# Altium footprint library 试用版PCB3D封装库.PcbLib: 91 footprints (part 3 of 6)
Each footprint in its own frame and in the unit in brackets; x right, y up, seen from the top. Pads: shape width x height; smd on the part's side, far side on the other; paste and mask are expansions set on the pad; w line width, h text height; cw(c..) or ccw(c..) is an arc to the next point about the centre after c.
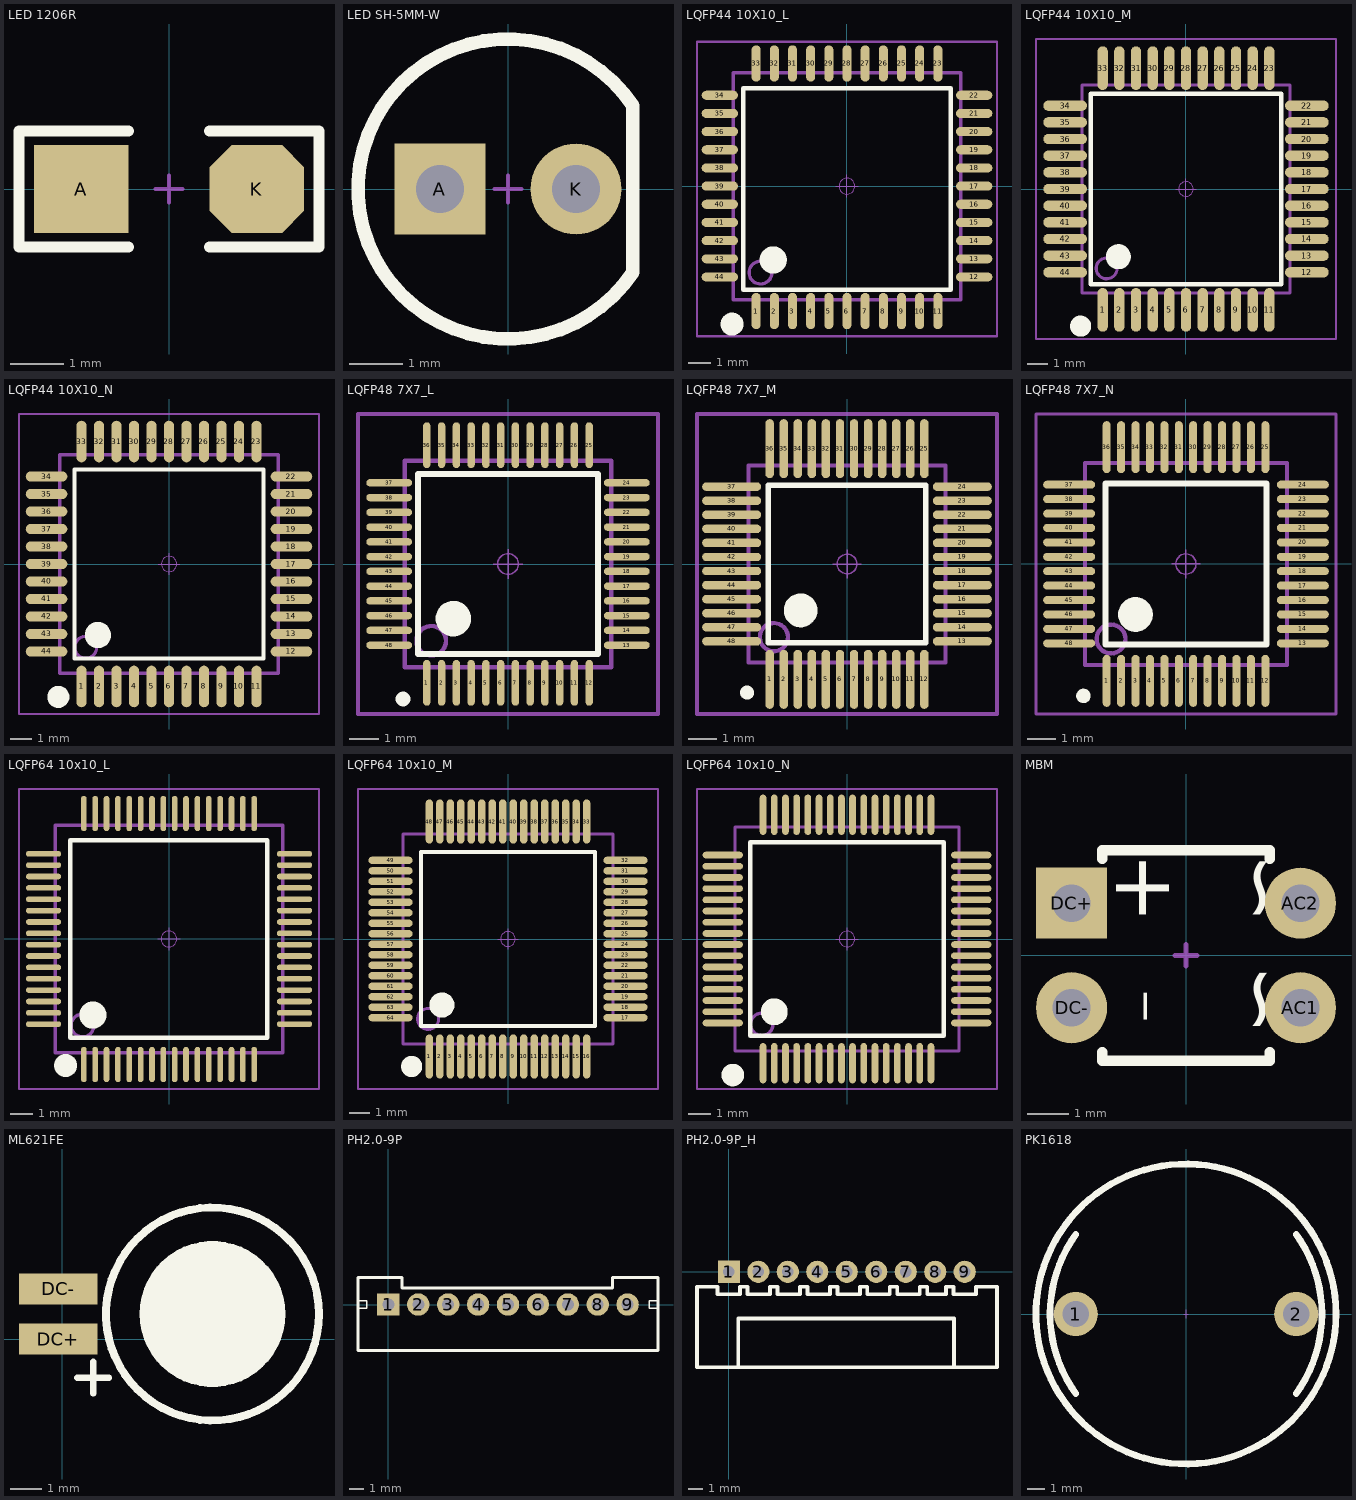
[diagram p2: the footprints below, top view; thin cyan lines are the x and y axes]

## LED 1206R [mil] "红色1206LED"
pads (2):
  rect 70x65 smd: A(-65,0)
  oct 70x65 smd: K(65,0)
Top Overlay:
  lines w8: -30,-43 -111,-43 -111,43 -109,43 -30,43 ; 30,-43 109,-43 ; 30,43 111,43 111,-43
Mechanical 15:
  lines w3: -10,0 10,0 ; 0,-10 0,10
3D body: height 35.58, standoff -0.16, extent -63.03,-31.54 63.03,31.54
3D body: height 39.57, standoff 19.88, extent -44.33,-31.54 44.33,31.54

## LED SH-5MM-W [mm] "白色5mm草帽，直插LED"
height 10.16
pads (2):
  rect 1.7x1.7 hole 0.9: A(-1.27,0)
  round 1.7 hole 0.9: K(1.27,0)
Top Overlay:
  lines w0.254: 2.33,-1.553 cw(c0,0) 2.33,1.553 2.33,-1.553
Mechanical 15:
  lines w0.076: -0.254,0 0.254,0 ; 0,-0.254 0,0.254
3D body: height 3.42, standoff -3.45, extent -1.584,-0.745 1.535,0.755
3D body: height 4.85, standoff 0.05, extent -2.75,-2.75 2.41,2.75

## LQFP44 10X10_L [mm] "10*10*1.4(长宽高，除引脚）"
pads (44):
  oval 0.4x1.6 smd: 1(-4,-5.5) 2(-3.2,-5.5) 3(-2.4,-5.5) 4(-1.6,-5.5) 5(-0.8,-5.5) 6(0,-5.5) 7(0.8,-5.5) 8(1.6,-5.5) 9(2.4,-5.5) 10(3.2,-5.5) 11(4,-5.5) 23(4,5.4) 24(3.2,5.4) 25(2.4,5.4) 26(1.6,5.4) 27(0.8,5.4) 28(0,5.4) 29(-0.8,5.4) 30(-1.6,5.4) 31(-2.4,5.4) 32(-3.2,5.4) 33(-4,5.4)
  oval 1.6x0.4 smd: 12(5.6,-4) 13(5.6,-3.2) 14(5.6,-2.4) 15(5.6,-1.6) 16(5.6,-0.8) 17(5.6,0) 18(5.6,0.8) 19(5.6,1.6) 20(5.6,2.4) 21(5.6,3.2) 22(5.6,4) 34(-5.6,4) 35(-5.6,3.2) 36(-5.6,2.4) 37(-5.6,1.6) 38(-5.6,0.8) 39(-5.6,0) 40(-5.6,-0.8) 41(-5.6,-1.6) 42(-5.6,-2.4) 43(-5.6,-3.2) 44(-5.6,-4)
Top Overlay:
  circle w0.6: c-3.25,-3.25 r0.3
  circle w0.508: c-5.06,-6.076 r0.25
  lines w0.2: -4.572,-4.572 -4.572,4.318 4.572,4.318 4.572,-4.572 -4.572,-4.572
Mechanical 13:
  circle w0.15: c-3.81,-3.81 r0.5
  lines w0.15: -5,-5 5,-5 5,5 -5,5 -5,-5
Mechanical 15:
  circle w0.05: c0,0 r0.35
  lines w0.05: -0.5,0 0.5,0 ; 0,-0.5 0,0.5
  lines w0.1: -6.604,-6.604 -6.604,6.35 6.604,6.35 6.604,-6.604 -6.604,-6.604
3D body: height 1.45, standoff 0, extent -6,-6 6,6

## LQFP44 10X10_M [mm] "10*10*1.4(长宽高，除引脚）"
pads (44):
  oval 0.5x2.1 smd: 1(-4,-5.8) 2(-3.2,-5.8) 3(-2.4,-5.8) 4(-1.6,-5.8) 5(-0.8,-5.8) 6(0,-5.8) 7(0.8,-5.8) 8(1.6,-5.8) 9(2.4,-5.8) 10(3.2,-5.8) 11(4,-5.8) 23(4,5.8) 24(3.2,5.8) 25(2.4,5.8) 26(1.6,5.8) 27(0.8,5.8) 28(0,5.8) 29(-0.8,5.8) 30(-1.6,5.8) 31(-2.4,5.8) 32(-3.2,5.8) 33(-4,5.8)
  oval 2.1x0.5 smd: 12(5.8,-4) 13(5.8,-3.2) 14(5.8,-2.4) 15(5.8,-1.6) 16(5.8,-0.8) 17(5.8,0) 18(5.8,0.8) 19(5.8,1.6) 20(5.8,2.4) 21(5.8,3.2) 22(5.8,4) 34(-5.8,4) 35(-5.8,3.2) 36(-5.8,2.4) 37(-5.8,1.6) 38(-5.8,0.8) 39(-5.8,0) 40(-5.8,-0.8) 41(-5.8,-1.6) 42(-5.8,-2.4) 43(-5.8,-3.2) 44(-5.8,-4)
Top Overlay:
  circle w0.6: c-3.25,-3.25 r0.3
  circle w0.508: c-5.06,-6.584 r0.25
  lines w0.2: -4.572,-4.572 -4.572,4.572 4.572,4.572 4.572,-4.572 -4.572,-4.572
Mechanical 13:
  circle w0.15: c-3.81,-3.81 r0.5
  lines w0.15: -5,-5 -5,5 5,5 5,-5 -5,-5
Mechanical 15:
  circle w0.05: c0,0 r0.35
  lines w0.05: -0.5,0 0.5,0 ; 0,-0.5 0,0.5
  lines w0.1: -7.2,-7.2 -7.2,7.2 7.2,7.2 7.2,-7.2 -7.2,-7.2
3D body: height 1.45, standoff 0, extent -6,-6 6,6

## LQFP44 10X10_N [mm] "10*10*1.4(长宽高，除引脚）"
pads (44):
  oval 0.45x1.9 smd: 1(-4,-5.6) 2(-3.2,-5.6) 3(-2.4,-5.6) 4(-1.6,-5.6) 5(-0.8,-5.6) 6(0,-5.6) 7(0.8,-5.6) 8(1.6,-5.6) 9(2.4,-5.6) 10(3.2,-5.6) 11(4,-5.6) 23(4,5.6) 24(3.2,5.6) 25(2.4,5.6) 26(1.6,5.6) 27(0.8,5.6) 28(0,5.6) 29(-0.8,5.6) 30(-1.6,5.6) 31(-2.4,5.6) 32(-3.2,5.6) 33(-4,5.6)
  oval 1.9x0.45 smd: 12(5.6,-4) 13(5.6,-3.2) 14(5.6,-2.4) 15(5.6,-1.6) 16(5.6,-0.8) 17(5.6,0) 18(5.6,0.8) 19(5.6,1.6) 20(5.6,2.4) 21(5.6,3.2) 22(5.6,4) 34(-5.6,4) 35(-5.6,3.2) 36(-5.6,2.4) 37(-5.6,1.6) 38(-5.6,0.8) 39(-5.6,0) 40(-5.6,-0.8) 41(-5.6,-1.6) 42(-5.6,-2.4) 43(-5.6,-3.2) 44(-5.6,-4)
Top Overlay:
  circle w0.508: c-5.06,-6.076 r0.25
  circle w0.6: c-3.25,-3.25 r0.3
  lines w0.2: -4.318,-4.318 -4.318,4.318 4.318,4.318 4.318,-4.318 -4.318,-4.318
Mechanical 13:
  circle w0.15: c-3.81,-3.81 r0.5
  lines w0.15: -5,-5 -5,5 5,5 5,-5 -5,-5
Mechanical 15:
  circle w0.05: c0,0 r0.35
  lines w0.05: -0.5,0 0.5,0 ; 0,-0.5 0,0.5
  lines w0.1: -6.858,-6.858 -6.858,6.858 6.858,6.858 6.858,-6.858 -6.858,-6.858
3D body: height 1.45, standoff 0, extent -6,-6 6,6

## LQFP48 7X7_L [mm] "7*7*1.4(长宽高，除引脚）"
height 1.6
pads (48):
  oval 0.25x1.55 smd: 1(-2.75,-4.025) 2(-2.25,-4.025) 3(-1.75,-4.025) 4(-1.25,-4.025) 5(-0.75,-4.025) 6(-0.25,-4.025) 7(0.25,-4.025) 8(0.75,-4.025) 9(1.25,-4.025) 10(1.75,-4.025) 11(2.25,-4.025) 12(2.75,-4.025) 25(2.75,4.025) 26(2.25,4.025) 27(1.75,4.025) 28(1.25,4.025) 29(0.75,4.025) 30(0.25,4.025) 31(-0.25,4.025) 32(-0.75,4.025) 33(-1.25,4.025) 34(-1.75,4.025) 35(-2.25,4.025) 36(-2.75,4.025)
  oval 1.55x0.25 smd: 13(4.025,-2.75) 14(4.025,-2.25) 15(4.025,-1.75) 16(4.025,-1.25) 17(4.025,-0.75) 18(4.025,-0.25) 19(4.025,0.25) 20(4.025,0.75) 21(4.025,1.25) 22(4.025,1.75) 23(4.025,2.25) 24(4.025,2.75) 37(-4.025,2.75) 38(-4.025,2.25) 39(-4.025,1.75) 40(-4.025,1.25) 41(-4.025,0.75) 42(-4.025,0.25) 43(-4.025,-0.25) 44(-4.025,-0.75) 45(-4.025,-1.25) 46(-4.025,-1.75) 47(-4.025,-2.25) 48(-4.025,-2.75)
Top Overlay:
  circle w0.25: c-3.556,-4.572 r0.125
  circle w0.6: c-1.85,-1.85 r0.3
  lines w0.2: -3.048,-3.048 3.048,-3.048 3.048,3.048 -3.048,3.048 -3.048,-3.048
Mechanical 13:
  circle w0.15: c-2.6,-2.6 r0.5
  lines w0.15: -3.5,-3.5 3.5,-3.5 3.5,3.5 -3.5,3.5 -3.5,-3.5
Mechanical 15:
  circle w0.05: c0,0 r0.35
  lines w0.05: -0.5,0 0.5,0 ; 0,-0.5 0,0.5
  lines w0.15: -5.08,-5.08 5.08,-5.08 5.08,5.08 -5.08,5.08 -5.08,-5.08
3D body: height 1.45, standoff 0, extent -4.5,-4.5 4.5,4.5

## LQFP48 7X7_M [mm] "7*7*1.4(长宽高，除引脚）"
height 1.6
pads (48):
  oval 0.3x2.1 smd: 1(-2.75,-4.1) 2(-2.25,-4.1) 3(-1.75,-4.1) 4(-1.25,-4.1) 5(-0.75,-4.1) 6(-0.25,-4.1) 7(0.25,-4.1) 8(0.75,-4.1) 9(1.25,-4.1) 10(1.75,-4.1) 11(2.25,-4.1) 12(2.75,-4.1) 25(2.75,4.1) 26(2.25,4.1) 27(1.75,4.1) 28(1.25,4.1) 29(0.75,4.1) 30(0.25,4.1) 31(-0.25,4.1) 32(-0.75,4.1) 33(-1.25,4.1) 34(-1.75,4.1) 35(-2.25,4.1) 36(-2.75,4.1)
  oval 2.1x0.3 smd: 13(4.1,-2.75) 14(4.1,-2.25) 15(4.1,-1.75) 16(4.1,-1.25) 17(4.1,-0.75) 18(4.1,-0.25) 19(4.1,0.25) 20(4.1,0.75) 21(4.1,1.25) 22(4.1,1.75) 23(4.1,2.25) 24(4.1,2.75) 37(-4.1,2.75) 38(-4.1,2.25) 39(-4.1,1.75) 40(-4.1,1.25) 41(-4.1,0.75) 42(-4.1,0.25) 43(-4.1,-0.25) 44(-4.1,-0.75) 45(-4.1,-1.25) 46(-4.1,-1.75) 47(-4.1,-2.25) 48(-4.1,-2.75)
Top Overlay:
  circle w0.6: c-1.65,-1.65 r0.3
  circle w0.25: c-3.556,-4.572 r0.125
  lines w0.2: -2.794,-2.794 -2.794,2.794 2.794,2.794 2.794,-2.794 -2.794,-2.794
Mechanical 13:
  circle w0.15: c-2.6,-2.6 r0.5
  lines w0.15: -3.5,-3.5 -3.5,3.5 3.5,3.5 3.5,-3.5 -3.5,-3.5
Mechanical 15:
  circle w0.05: c0,0 r0.35
  lines w0.05: -0.5,0 0.5,0 ; 0,-0.5 0,0.5
  lines w0.15: -5.334,-5.334 -5.334,5.334 5.334,5.334 5.334,-5.334 -5.334,-5.334
3D body: height 1.45, standoff 0, extent -4.5,-4.5 4.5,4.5

## LQFP48 7X7_N [mm] "7*7*1.4(长宽高，除引脚）"
height 1.6
pads (48):
  oval 0.279x1.8 smd: 1(-2.75,-4.05) 2(-2.25,-4.05) 3(-1.75,-4.05) 4(-1.25,-4.05) 5(-0.75,-4.05) 6(-0.25,-4.05) 7(0.25,-4.05) 8(0.75,-4.05) 9(1.25,-4.05) 10(1.75,-4.05) 11(2.25,-4.05) 12(2.75,-4.05) 25(2.75,4.05) 26(2.25,4.05) 27(1.75,4.05) 28(1.25,4.05) 29(0.75,4.05) 30(0.25,4.05) 31(-0.25,4.05) 32(-0.75,4.05) 33(-1.25,4.05) 34(-1.75,4.05) 35(-2.25,4.05) 36(-2.75,4.05)
  oval 1.8x0.279 smd: 13(4.05,-2.75) 14(4.05,-2.25) 15(4.05,-1.75) 16(4.05,-1.25) 17(4.05,-0.75) 18(4.05,-0.25) 19(4.05,0.25) 20(4.05,0.75) 21(4.05,1.25) 22(4.05,1.75) 23(4.05,2.25) 24(4.05,2.75) 37(-4.05,2.75) 38(-4.05,2.25) 39(-4.05,1.75) 40(-4.05,1.25) 41(-4.05,0.75) 42(-4.05,0.25) 43(-4.05,-0.25) 44(-4.05,-0.75) 45(-4.05,-1.25) 46(-4.05,-1.75) 47(-4.05,-2.25) 48(-4.05,-2.75)
Top Overlay:
  circle w0.25: c-3.556,-4.572 r0.125
  circle w0.6: c-1.75,-1.75 r0.3
  lines w0.2: -2.794,-2.794 2.794,-2.794 2.794,2.794 -2.794,2.794 -2.794,-2.794
Mechanical 13:
  circle w0.15: c-2.6,-2.6 r0.5
  lines w0.15: -3.5,-3.5 -3.5,3.5 3.5,3.5 3.5,-3.5 -3.5,-3.5
Mechanical 15:
  circle w0.05: c0,0 r0.35
  lines w0.05: -0.5,0 0.5,0 ; 0,-0.5 0,0.5
  lines w0.1: -5.2,-5.2 5.2,-5.2 5.2,5.2 -5.2,5.2 -5.2,-5.2
3D body: height 1.45, standoff 0, extent -4.5,-4.5 4.5,4.5

## LQFP64 10x10_L [mm] "14*14*1.4(长宽高，除引脚）"
height 1.6
pads (64):
  oval 0.25x1.55 smd: 1(-3.75,-5.525) 2(-3.25,-5.525) 3(-2.75,-5.525) 4(-2.25,-5.525) 5(-1.75,-5.525) 6(-1.25,-5.525) 7(-0.75,-5.525) 8(-0.25,-5.525) 9(0.25,-5.525) 10(0.75,-5.525) 11(1.25,-5.525) 12(1.75,-5.525) 13(2.25,-5.525) 14(2.75,-5.525) 15(3.25,-5.525) 16(3.75,-5.525) 33(3.75,5.525) 34(3.25,5.525) 35(2.75,5.525) 36(2.25,5.525) 37(1.75,5.525) 38(1.25,5.525) 39(0.75,5.525) 40(0.25,5.525) 41(-0.25,5.525) 42(-0.75,5.525) 43(-1.25,5.525) 44(-1.75,5.525) 45(-2.25,5.525) 46(-2.75,5.525) 47(-3.25,5.525) 48(-3.75,5.525)
  oval 1.55x0.25 smd: 17(5.525,-3.75) 18(5.525,-3.25) 19(5.525,-2.75) 20(5.525,-2.25) 21(5.525,-1.75) 22(5.525,-1.25) 23(5.525,-0.75) 24(5.525,-0.25) 25(5.525,0.25) 26(5.525,0.75) 27(5.525,1.25) 28(5.525,1.75) 29(5.525,2.25) 30(5.525,2.75) 31(5.525,3.25) 32(5.525,3.75) 49(-5.525,3.75) 50(-5.525,3.25) 51(-5.525,2.75) 52(-5.525,2.25) 53(-5.525,1.75) 54(-5.525,1.25) 55(-5.525,0.75) 56(-5.525,0.25) 57(-5.525,-0.25) 58(-5.525,-0.75) 59(-5.525,-1.25) 60(-5.525,-1.75) 61(-5.525,-2.25) 62(-5.525,-2.75) 63(-5.525,-3.25) 64(-5.525,-3.75)
Top Overlay:
  circle w0.6: c-3.35,-3.35 r0.3
  circle w0.508: c-4.552,-5.568 r0.25
  lines w0.2: -4.35,-4.35 -4.35,4.35 4.318,4.35 4.318,-4.35 -4.35,-4.35
Mechanical 13:
  circle w0.15: c-3.81,-3.81 r0.5
  lines w0.15: -5,-5 -5,5 5,5 5,-5 -5,-5
Mechanical 15:
  circle w0.05: c0,0 r0.35
  lines w0.05: -0.5,0 0.5,0 ; 0,-0.5 0,0.5
  lines w0.1: -6.604,-6.604 -6.604,6.604 6.604,6.604 6.604,-6.604 -6.604,-6.604
3D body: height 1.45, standoff 0, extent -6,-6 6,6

## LQFP64 10x10_M [mm] "14*14*1.4(长宽高，除引脚）"
height 1.6
pads (64):
  oval 0.35x2.1 smd: 1(-3.75,-5.6) 2(-3.25,-5.6) 3(-2.75,-5.6) 4(-2.25,-5.6) 5(-1.75,-5.6) 6(-1.25,-5.6) 7(-0.75,-5.6) 8(-0.25,-5.6) 9(0.25,-5.6) 10(0.75,-5.6) 11(1.25,-5.6) 12(1.75,-5.6) 13(2.25,-5.6) 14(2.75,-5.6) 15(3.25,-5.6) 16(3.75,-5.6) 33(3.75,5.6) 34(3.25,5.6) 35(2.75,5.6) 36(2.25,5.6) 37(1.75,5.6) 38(1.25,5.6) 39(0.75,5.6) 40(0.25,5.6) 41(-0.25,5.6) 42(-0.75,5.6) 43(-1.25,5.6) 44(-1.75,5.6) 45(-2.25,5.6) 46(-2.75,5.6) 47(-3.25,5.6) 48(-3.75,5.6)
  oval 2.1x0.35 smd: 17(5.6,-3.75) 18(5.6,-3.25) 19(5.6,-2.75) 20(5.6,-2.25) 21(5.6,-1.75) 22(5.6,-1.25) 23(5.6,-0.75) 24(5.6,-0.25) 25(5.6,0.25) 26(5.6,0.75) 27(5.6,1.25) 28(5.6,1.75) 29(5.6,2.25) 30(5.6,2.75) 31(5.6,3.25) 32(5.6,3.75) 49(-5.6,3.75) 50(-5.6,3.25) 51(-5.6,2.75) 52(-5.6,2.25) 53(-5.6,1.75) 54(-5.6,1.25) 55(-5.6,0.75) 56(-5.6,0.25) 57(-5.6,-0.25) 58(-5.6,-0.75) 59(-5.6,-1.25) 60(-5.6,-1.75) 61(-5.6,-2.25) 62(-5.6,-2.75) 63(-5.6,-3.25) 64(-5.6,-3.75)
Top Overlay:
  circle w0.6: c-3.15,-3.15 r0.3
  circle w0.508: c-4.592,-6.076 r0.25
  lines w0.2: -4.15,-4.15 -4.15,4.15 4.15,4.15 4.15,-4.15 -4.15,-4.15
Mechanical 13:
  circle w0.15: c-3.81,-3.81 r0.5
  lines w0.15: -5,-5 5,-5 5,5 -5,5 -5,-5
Mechanical 15:
  circle w0.05: c0,0 r0.35
  lines w0.05: -0.5,0 0.5,0 ; 0,-0.5 0,0.5
  lines w0.1: -7.15,-7.15 -7.15,7.15 7.15,7.15 7.15,-7.15 -7.15,-7.15
3D body: height 1.45, standoff 0, extent -6,-6 6,6

## LQFP64 10x10_N [mm] "14*14*1.4(长宽高，除引脚）"
height 1.6
pads (64):
  oval 0.3x1.8 smd: 1(-3.75,-5.55) 2(-3.25,-5.55) 3(-2.75,-5.55) 4(-2.25,-5.55) 5(-1.75,-5.55) 6(-1.25,-5.55) 7(-0.75,-5.55) 8(-0.25,-5.55) 9(0.25,-5.55) 10(0.75,-5.55) 11(1.25,-5.55) 12(1.75,-5.55) 13(2.25,-5.55) 14(2.75,-5.55) 15(3.25,-5.55) 16(3.75,-5.55) 33(3.75,5.55) 34(3.25,5.55) 35(2.75,5.55) 36(2.25,5.55) 37(1.75,5.55) 38(1.25,5.55) 39(0.75,5.55) 40(0.25,5.55) 41(-0.25,5.55) 42(-0.75,5.55) 43(-1.25,5.55) 44(-1.75,5.55) 45(-2.25,5.55) 46(-2.75,5.55) 47(-3.25,5.55) 48(-3.75,5.55)
  oval 1.8x0.3 smd: 17(5.55,-3.75) 18(5.55,-3.25) 19(5.55,-2.75) 20(5.55,-2.25) 21(5.55,-1.75) 22(5.55,-1.25) 23(5.55,-0.75) 24(5.55,-0.25) 25(5.55,0.25) 26(5.55,0.75) 27(5.55,1.25) 28(5.55,1.75) 29(5.55,2.25) 30(5.55,2.75) 31(5.55,3.25) 32(5.55,3.75) 49(-5.55,3.75) 50(-5.55,3.25) 51(-5.55,2.75) 52(-5.55,2.25) 53(-5.55,1.75) 54(-5.55,1.25) 55(-5.55,0.75) 56(-5.55,0.25) 57(-5.55,-0.25) 58(-5.55,-0.75) 59(-5.55,-1.25) 60(-5.55,-1.75) 61(-5.55,-2.25) 62(-5.55,-2.75) 63(-5.55,-3.25) 64(-5.55,-3.75)
Top Overlay:
  circle w0.6: c-3.25,-3.25 r0.3
  circle w0.508: c-5.1,-6.076 r0.25
  lines w0.2: -4.318,-4.318 4.318,-4.318 4.318,4.318 -4.318,4.318 -4.318,-4.318
Mechanical 13:
  circle w0.15: c-3.81,-3.81 r0.5
  lines w0.15: -5,-5 -5,5 5,5 5,-5 -5,-5
Mechanical 15:
  circle w0.05: c0,0 r0.35
  lines w0.05: -0.5,0 0.5,0 ; 0,-0.5 0,0.5
  lines w0.1: -6.7,-6.7 6.7,-6.7 6.7,6.7 -6.7,6.7 -6.7,-6.7
3D body: height 1.45, standoff 0, extent -6,-6 6,6

## MBM [mm] "4.8*5.2*2.5mm(长宽高)"
pads (4):
  round 1.7 hole 0.9: AC1(2.737,-1.25) AC2(2.737,1.25) DC-(-2.737,-1.25)
  rect 1.7x1.7 hole 0.9: DC+(-2.737,1.25)
Top Overlay:
  lines w0.254: -2.007,-2.311 -2.007,-2.515 2.007,-2.515 2.007,-2.311 ; -2.007,2.311 -2.007,2.515 2.007,2.515 2.007,2.311
  text "~" at 0.635,-1.905 h2.54
  text "~" at 0.635,0.762 h2.54
  text "-" at -2.159,-1.651 h3.05
  text "+" at -2.159,0.762 h2.54
Mechanical 15:
  lines w0.127: -0.254,0 0.254,0 ; 0,-0.254 0,0.254
3D body: height 2.6, standoff -3.11, extent -3.154,-2.4 3.094,2.4

## ML621FE [mm] "可充电纽扣电池"
pads (2):
  rect 2.5x1 smd: DC+(-0.127,0) DC-(-0.127,1.6)
Top Overlay:
  circle w0.254: c4.8,0.8 r3.4
  circle w0.254: c4.8,0.8 r2.2
  circle w2.2: c4.8,0.8 r1.024
  lines w0.203: 0.482,-1.232 1.498,-1.232 ; 0.99,-1.74 0.99,-0.724
Mechanical 15:
  lines w0.1: 4.292,0.8 5.308,0.8 ; 4.8,0.292 4.8,1.308
3D body: height 2.45, standoff 0.04, extent -0.7,-2.598 8.198,4.198

## PH2.0-9P [mm] "接插件/1A"
height 10
pads (9):
  rect 1.5x1.5 hole 0.8: 1(0,0)
  round 1.5 hole 0.8: 2(2,0) 3(4,0) 4(6,0) 5(8,0) 6(10,0) 7(12,0) 8(14,0) 9(16,0)
Top Overlay:
  lines w0.1: -2.032,-0.246 -1.452,-0.246 -1.452,0.254 -2.032,0.254 ; 18.032,-0.246 17.452,-0.246 17.452,0.254 18.032,0.254
  lines w0.2: -2.032,1.816 -2.032,-3.084 18.032,-3.084 18.032,1.816 ; 0.92,1.816 0.92,1.1 14.984,1.1 14.984,1.816
  lines w0.203: -2.032,1.816 0.92,1.816 ; 14.984,1.816 18.032,1.816
3D body: height 6.02, standoff -2.98, extent -1.95,-3 17.95,1.7

## PH2.0-9P_H [mm] "接插件/1A"
height 10
pads (9):
  rect 1.5x1.5 hole 0.8: 1(0,0)
  round 1.5 hole 0.8: 2(2,0) 3(4,0) 4(6,0) 5(8,0) 6(10,0) 7(12,0) 8(14,0) 9(16,0)
Top Overlay:
  lines w0.254: 3.27,-6.477 18.191,-6.477 18.191,-1.016 16.764,-1.016 16.764,-1.524 15.24,-1.524 15.24,-1.016 14.732,-1.016 14.732,-1.524 13.462,-1.524 13.462,-1.016 12.954,-1.016 12.954,-1.524 12.7,-1.524 11.43,-1.524 11.43,-1.016 10.922,-1.016 10.922,-1.524 9.398,-1.524 9.398,-1.016 8.89,-1.016 8.89,-1.524 7.366,-1.524 7.366,-1.016 6.858,-1.016 6.858,-1.524 5.334,-1.524 5.334,-1.016 4.826,-1.016 4.826,-1.524 3.302,-1.524 3.302,-1.016 2.794,-1.016 2.794,-1.524 1.27,-1.524 1.27,-1.016 0.762,-1.016 0.762,-1.524 -0.762,-1.524 -0.762,-1.016 -2.159,-1.016 -2.159,-6.477 0.635,-6.477 ; 11.27,-6.477 0.635,-6.477 ; 15.27,-6.477 15.27,-3.175 0.635,-3.175 0.635,-6.477
3D body: height 4.72, standoff -2.68, extent -1.95,-6.3 17.95,0.3

## PK1618 [mm] "12.5*17*20mm(脚距，直径，高）"
pads (2):
  round 2.5 hole 1.5: 1(-6.25,0) 2(6.25,0)
Top Overlay:
  circle w0.381: c0,0 r8.5
  lines w0.381: -6.25,-4.5 cw(c0,0) -6.25,4.5 ; 6.25,-4.5 ccw(c0,0) 6.25,4.5
Mechanical 15:
  lines w0.01: -0.127,0 0.127,0 ; 0,-0.254 0,0.254
3D body: height 20.02, standoff -2.78, extent -8.5,-8.5 8.5,8.5